# Altium footprint library con-samtec.PCBLIB: 805 footprints (part 51 of 55) (continued)
## TSW-146-02-S-D-RA [mil]
pads (92):
  oct 59.06x59.06 hole 39.37: 1(2250,60) 2(2250,160) 3(2150,60) 4(2150,160) 5(2050,60) 6(2050,160) 7(1950,60) 8(1950,160) 9(1850,60) 10(1850,160) 11(1750,60) 12(1750,160) 13(1650,60) 14(1650,160) 15(1550,60) 16(1550,160) 17(1450,60) 18(1450,160) 19(1350,60) 20(1350,160) 21(1250,60) 22(1250,160) 23(1150,60) 24(1150,160) 25(1050,60) 26(1050,160) 27(950,60) 28(950,160) 29(850,60) 30(850,160) 31(750,60) 32(750,160) 33(650,60) 34(650,160) 35(550,60) 36(550,160) 37(450,60) 38(450,160) 39(350,60) 40(350,160) 41(250,60) 42(250,160) 43(150,60) 44(150,160) 45(50,60) 46(50,160) 47(-50,60) 48(-50,160) 49(-150,60) 50(-150,160) 51(-250,60) 52(-250,160) 53(-350,60) 54(-350,160) 55(-450,60) 56(-450,160) 57(-550,60) 58(-550,160) 59(-650,60) 60(-650,160) 61(-750,60) 62(-750,160) 63(-850,60) 64(-850,160) 65(-950,60) 66(-950,160) 67(-1050,60) 68(-1050,160) 69(-1150,60) 70(-1150,160) 71(-1250,60) 72(-1250,160) 73(-1350,60) 74(-1350,160) 75(-1450,60) 76(-1450,160) 77(-1550,60) 78(-1550,160) 79(-1650,60) 80(-1650,160) 81(-1750,60) 82(-1750,160) 83(-1850,60) 84(-1850,160) 85(-1950,60) 86(-1950,160) 87(-2050,60) 88(-2050,160) 89(-2150,60) 90(-2150,160) 91(-2250,60) 92(-2250,160)
Top Overlay:
  rectangle: -2260,-310.63 -2240,-80.32
  rectangle: -2160,-310.63 -2140,-80.32
  rectangle: -2060,-310.63 -2040,-80.32
  rectangle: -1960,-310.63 -1940,-80.32
  rectangle: -1860,-310.63 -1840,-80.32
  rectangle: -1760,-310.63 -1740,-80.32
  rectangle: -1660,-310.63 -1640,-80.32
  rectangle: -1560,-310.63 -1540,-80.32
  rectangle: -1460,-310.63 -1440,-80.32
  rectangle: -1360,-310.63 -1340,-80.32
  rectangle: -1260,-310.63 -1240,-80.32
  rectangle: -1160,-310.63 -1140,-80.32
  rectangle: -1060,-310.63 -1040,-80.32
  rectangle: -960,-310.63 -940,-80.32
  rectangle: -860,-310.63 -840,-80.32
  rectangle: -760,-310.63 -740,-80.32
  rectangle: -660,-310.63 -640,-80.32
  rectangle: -560,-310.63 -540,-80.32
  rectangle: -460,-310.63 -440,-80.32
  rectangle: -360,-310.63 -340,-80.32
  rectangle: -260,-310.63 -240,-80.32
  rectangle: -160,-310.63 -140,-80.32
  rectangle: -60,-310.63 -40,-80.32
  rectangle: 40,-310.63 60,-80.32
  rectangle: 140,-310.63 160,-80.32
  rectangle: 240,-310.63 260,-80.32
  rectangle: 340,-310.63 360,-80.32
  rectangle: 440,-310.63 460,-80.32
  rectangle: 540,-310.63 560,-80.32
  rectangle: 640,-310.63 660,-80.32
  rectangle: 740,-310.63 760,-80.32
  rectangle: 840,-310.63 860,-80.32
  rectangle: 940,-310.63 960,-80.32
  rectangle: 1040,-310.63 1060,-80.32
  rectangle: 1140,-310.63 1160,-80.32
  rectangle: 1240,-310.63 1260,-80.32
  rectangle: 1340,-310.63 1360,-80.32
  rectangle: 1440,-310.63 1460,-80.32
  rectangle: 1540,-310.63 1560,-80.32
  rectangle: 1640,-310.63 1660,-80.32
  rectangle: 1740,-310.63 1760,-80.32
  rectangle: 1840,-310.63 1860,-80.32
  rectangle: 1940,-310.63 1960,-80.32
  rectangle: 2040,-310.63 2060,-80.32
  rectangle: 2140,-310.63 2160,-80.32
  rectangle: 2240,-310.63 2260,-80.32
  lines w8: -2305.08,-80.55 2305.08,-80.55 2305.08,-4.17 -2305.08,-4.17 -2305.08,-80.55
  text "1" at 2300.59,30.51 h36.81
  text "2" at 2299.21,129.53 h36.81
Mechanical 16:
  rectangle: -2260,0 -2240,170
  rectangle: -2160,0 -2140,170
  rectangle: -2060,0 -2040,170
  rectangle: -1960,0 -1940,170
  rectangle: -1860,0 -1840,170
  rectangle: -1760,0 -1740,170
  rectangle: -1660,0 -1640,170
  rectangle: -1560,0 -1540,170
  rectangle: -1460,0 -1440,170
  rectangle: -1360,0 -1340,170
  rectangle: -1260,0 -1240,170
  rectangle: -1160,0 -1140,170
  rectangle: -1060,0 -1040,170
  rectangle: -960,0 -940,170
  rectangle: -860,0 -840,170
  rectangle: -760,0 -740,170
  rectangle: -660,0 -640,170
  rectangle: -560,0 -540,170
  rectangle: -460,0 -440,170
  rectangle: -360,0 -340,170
  rectangle: -260,0 -240,170
  rectangle: -160,0 -140,170
  rectangle: -60,0 -40,170
  rectangle: 40,0 60,170
  rectangle: 140,0 160,170
  rectangle: 240,0 260,170
  rectangle: 340,0 360,170
  rectangle: 440,0 460,170
  rectangle: 540,0 560,170
  rectangle: 640,0 660,170
  rectangle: 740,0 760,170
  rectangle: 840,0 860,170
  rectangle: 940,0 960,170
  rectangle: 1040,0 1060,170
  rectangle: 1140,0 1160,170
  rectangle: 1240,0 1260,170
  rectangle: 1340,0 1360,170
  rectangle: 1440,0 1460,170
  rectangle: 1540,0 1560,170
  rectangle: 1640,0 1660,170
  rectangle: 1740,0 1760,170
  rectangle: 1840,0 1860,170
  rectangle: 1940,0 1960,170
  rectangle: 2040,0 2060,170
  rectangle: 2140,0 2160,170
  rectangle: 2240,0 2260,170

## TSW-146-02-S-Q [mm]
pads (92):
  oct 1.5x1.5 hole 1: 1(57.15,-2.54) 2(57.15,2.54) 3(54.61,-2.54) 4(54.61,2.54) 5(52.07,-2.54) 6(52.07,2.54) 7(49.53,-2.54) 8(49.53,2.54) 9(46.99,-2.54) 10(46.99,2.54) 11(44.45,-2.54) 12(44.45,2.54) 13(41.91,-2.54) 14(41.91,2.54) 15(39.37,-2.54) 16(39.37,2.54) 17(36.83,-2.54) 18(36.83,2.54) 19(34.29,-2.54) 20(34.29,2.54) 21(31.75,-2.54) 22(31.75,2.54) 23(29.21,-2.54) 24(29.21,2.54) 25(26.67,-2.54) 26(26.67,2.54) 27(24.13,-2.54) 28(24.13,2.54) 29(21.59,-2.54) 30(21.59,2.54) 31(19.05,-2.54) 32(19.05,2.54) 33(16.51,-2.54) 34(16.51,2.54) 35(13.97,-2.54) 36(13.97,2.54) 37(11.43,-2.54) 38(11.43,2.54) 39(8.89,-2.54) 40(8.89,2.54) 41(6.35,-2.54) 42(6.35,2.54) 43(3.81,-2.54) 44(3.81,2.54) 45(1.27,-2.54) 46(1.27,2.54) 47(-1.27,-2.54) 48(-1.27,2.54) 49(-3.81,-2.54) 50(-3.81,2.54) 51(-6.35,-2.54) 52(-6.35,2.54) 53(-8.89,-2.54) 54(-8.89,2.54) 55(-11.43,-2.54) 56(-11.43,2.54) 57(-13.97,-2.54) 58(-13.97,2.54) 59(-16.51,-2.54) 60(-16.51,2.54) 61(-19.05,-2.54) 62(-19.05,2.54) 63(-21.59,-2.54) 64(-21.59,2.54) 65(-24.13,-2.54) 66(-24.13,2.54) 67(-26.67,-2.54) 68(-26.67,2.54) 69(-29.21,-2.54) 70(-29.21,2.54) 71(-31.75,-2.54) 72(-31.75,2.54) 73(-34.29,-2.54) 74(-34.29,2.54) 75(-36.83,-2.54) 76(-36.83,2.54) 77(-39.37,-2.54) 78(-39.37,2.54) 79(-41.91,-2.54) 80(-41.91,2.54) 81(-44.45,-2.54) 82(-44.45,2.54) 83(-46.99,-2.54) 84(-46.99,2.54) 85(-49.53,-2.54) 86(-49.53,2.54) 87(-52.07,-2.54) 88(-52.07,2.54) 89(-54.61,-2.54) 90(-54.61,2.54) 91(-57.15,-2.54) 92(-57.15,2.54)
Top Overlay:
  lines w0.203: -58.549,-3.695 58.549,-3.695 58.549,3.695 -58.549,3.695 -58.549,-3.695
  text "1" at 56.992,-5.138 h0.94
  text "2" at 56.892,3.989 h0.94
Mechanical 16:
  rectangle: -57.5,-2.89 -56.8,-2.19
  rectangle: -57.5,2.19 -56.8,2.89
  rectangle: -54.96,-2.89 -54.26,-2.19
  rectangle: -54.96,2.19 -54.26,2.89
  rectangle: -52.42,-2.89 -51.72,-2.19
  rectangle: -52.42,2.19 -51.72,2.89
  rectangle: -49.88,-2.89 -49.18,-2.19
  rectangle: -49.88,2.19 -49.18,2.89
  rectangle: -47.34,-2.89 -46.64,-2.19
  rectangle: -47.34,2.19 -46.64,2.89
  rectangle: -44.8,-2.89 -44.1,-2.19
  rectangle: -44.8,2.19 -44.1,2.89
  rectangle: -42.26,-2.89 -41.56,-2.19
  rectangle: -42.26,2.19 -41.56,2.89
  rectangle: -39.72,-2.89 -39.02,-2.19
  rectangle: -39.72,2.19 -39.02,2.89
  rectangle: -37.18,-2.89 -36.48,-2.19
  rectangle: -37.18,2.19 -36.48,2.89
  rectangle: -34.64,-2.89 -33.94,-2.19
  rectangle: -34.64,2.19 -33.94,2.89
  rectangle: -32.1,-2.89 -31.4,-2.19
  rectangle: -32.1,2.19 -31.4,2.89
  rectangle: -29.56,-2.89 -28.86,-2.19
  rectangle: -29.56,2.19 -28.86,2.89
  rectangle: -27.02,-2.89 -26.32,-2.19
  rectangle: -27.02,2.19 -26.32,2.89
  rectangle: -24.48,-2.89 -23.78,-2.19
  rectangle: -24.48,2.19 -23.78,2.89
  rectangle: -21.94,-2.89 -21.24,-2.19
  rectangle: -21.94,2.19 -21.24,2.89
  rectangle: -19.4,-2.89 -18.7,-2.19
  rectangle: -19.4,2.19 -18.7,2.89
  rectangle: -16.86,-2.89 -16.16,-2.19
  rectangle: -16.86,2.19 -16.16,2.89
  rectangle: -14.32,-2.89 -13.62,-2.19
  rectangle: -14.32,2.19 -13.62,2.89
  rectangle: -11.78,-2.89 -11.08,-2.19
  rectangle: -11.78,2.19 -11.08,2.89
  rectangle: -9.24,-2.89 -8.54,-2.19
  rectangle: -9.24,2.19 -8.54,2.89
  rectangle: -6.7,-2.89 -6,-2.19
  rectangle: -6.7,2.19 -6,2.89
  rectangle: -4.16,-2.89 -3.46,-2.19
  rectangle: -4.16,2.19 -3.46,2.89
  rectangle: -1.62,-2.89 -0.92,-2.19
  rectangle: -1.62,2.19 -0.92,2.89
  rectangle: 0.92,-2.89 1.62,-2.19
  rectangle: 0.92,2.19 1.62,2.89
  rectangle: 3.46,-2.89 4.16,-2.19
  rectangle: 3.46,2.19 4.16,2.89
  rectangle: 6,-2.89 6.7,-2.19
  rectangle: 6,2.19 6.7,2.89
  rectangle: 8.54,-2.89 9.24,-2.19
  rectangle: 8.54,2.19 9.24,2.89
  rectangle: 11.08,-2.89 11.78,-2.19
  rectangle: 11.08,2.19 11.78,2.89
  rectangle: 13.62,-2.89 14.32,-2.19
  rectangle: 13.62,2.19 14.32,2.89
  rectangle: 16.16,-2.89 16.86,-2.19
  rectangle: 16.16,2.19 16.86,2.89
  rectangle: 18.7,-2.89 19.4,-2.19
  rectangle: 18.7,2.19 19.4,2.89
  rectangle: 21.24,-2.89 21.94,-2.19
  rectangle: 21.24,2.19 21.94,2.89
  rectangle: 23.78,-2.89 24.48,-2.19
  rectangle: 23.78,2.19 24.48,2.89
  rectangle: 26.32,-2.89 27.02,-2.19
  rectangle: 26.32,2.19 27.02,2.89
  rectangle: 28.86,-2.89 29.56,-2.19
  rectangle: 28.86,2.19 29.56,2.89
  rectangle: 31.4,-2.89 32.1,-2.19
  rectangle: 31.4,2.19 32.1,2.89
  rectangle: 33.94,-2.89 34.64,-2.19
  rectangle: 33.94,2.19 34.64,2.89
  rectangle: 36.48,-2.89 37.18,-2.19
  rectangle: 36.48,2.19 37.18,2.89
  rectangle: 39.02,-2.89 39.72,-2.19
  rectangle: 39.02,2.19 39.72,2.89
  rectangle: 41.56,-2.89 42.26,-2.19
  rectangle: 41.56,2.19 42.26,2.89
  rectangle: 44.1,-2.89 44.8,-2.19
  rectangle: 44.1,2.19 44.8,2.89
  rectangle: 46.64,-2.89 47.34,-2.19
  rectangle: 46.64,2.19 47.34,2.89
  rectangle: 49.18,-2.89 49.88,-2.19
  rectangle: 49.18,2.19 49.88,2.89
  rectangle: 51.72,-2.89 52.42,-2.19
  rectangle: 51.72,2.19 52.42,2.89
  rectangle: 54.26,-2.89 54.96,-2.19
  rectangle: 54.26,2.19 54.96,2.89
  rectangle: 56.8,-2.89 57.5,-2.19
  rectangle: 56.8,2.19 57.5,2.89

## TSW-146-02-S-Q-RA [mil]
pads (92):
  oct 59.06x59.06 hole 39.37: 1(2250,60) 2(2250,260) 3(2150,60) 4(2150,260) 5(2050,60) 6(2050,260) 7(1950,60) 8(1950,260) 9(1850,60) 10(1850,260) 11(1750,60) 12(1750,260) 13(1650,60) 14(1650,260) 15(1550,60) 16(1550,260) 17(1450,60) 18(1450,260) 19(1350,60) 20(1350,260) 21(1250,60) 22(1250,260) 23(1150,60) 24(1150,260) 25(1050,60) 26(1050,260) 27(950,60) 28(950,260) 29(850,60) 30(850,260) 31(750,60) 32(750,260) 33(650,60) 34(650,260) 35(550,60) 36(550,260) 37(450,60) 38(450,260) 39(350,60) 40(350,260) 41(250,60) 42(250,260) 43(150,60) 44(150,260) 45(50,60) 46(50,260) 47(-50,60) 48(-50,260) 49(-150,60) 50(-150,260) 51(-250,60) 52(-250,260) 53(-350,60) 54(-350,260) 55(-450,60) 56(-450,260) 57(-550,60) 58(-550,260) 59(-650,60) 60(-650,260) 61(-750,60) 62(-750,260) 63(-850,60) 64(-850,260) 65(-950,60) 66(-950,260) 67(-1050,60) 68(-1050,260) 69(-1150,60) 70(-1150,260) 71(-1250,60) 72(-1250,260) 73(-1350,60) 74(-1350,260) 75(-1450,60) 76(-1450,260) 77(-1550,60) 78(-1550,260) 79(-1650,60) 80(-1650,260) 81(-1750,60) 82(-1750,260) 83(-1850,60) 84(-1850,260) 85(-1950,60) 86(-1950,260) 87(-2050,60) 88(-2050,260) 89(-2150,60) 90(-2150,260) 91(-2250,60) 92(-2250,260)
Top Overlay:
  rectangle: -2260,-310.63 -2240,-80.32
  rectangle: -2160,-310.63 -2140,-80.32
  rectangle: -2060,-310.63 -2040,-80.32
  rectangle: -1960,-310.63 -1940,-80.32
  rectangle: -1860,-310.63 -1840,-80.32
  rectangle: -1760,-310.63 -1740,-80.32
  rectangle: -1660,-310.63 -1640,-80.32
  rectangle: -1560,-310.63 -1540,-80.32
  rectangle: -1460,-310.63 -1440,-80.32
  rectangle: -1360,-310.63 -1340,-80.32
  rectangle: -1260,-310.63 -1240,-80.32
  rectangle: -1160,-310.63 -1140,-80.32
  rectangle: -1060,-310.63 -1040,-80.32
  rectangle: -960,-310.63 -940,-80.32
  rectangle: -860,-310.63 -840,-80.32
  rectangle: -760,-310.63 -740,-80.32
  rectangle: -660,-310.63 -640,-80.32
  rectangle: -560,-310.63 -540,-80.32
  rectangle: -460,-310.63 -440,-80.32
  rectangle: -360,-310.63 -340,-80.32
  rectangle: -260,-310.63 -240,-80.32
  rectangle: -160,-310.63 -140,-80.32
  rectangle: -60,-310.63 -40,-80.32
  rectangle: 40,-310.63 60,-80.32
  rectangle: 140,-310.63 160,-80.32
  rectangle: 240,-310.63 260,-80.32
  rectangle: 340,-310.63 360,-80.32
  rectangle: 440,-310.63 460,-80.32
  rectangle: 540,-310.63 560,-80.32
  rectangle: 640,-310.63 660,-80.32
  rectangle: 740,-310.63 760,-80.32
  rectangle: 840,-310.63 860,-80.32
  rectangle: 940,-310.63 960,-80.32
  rectangle: 1040,-310.63 1060,-80.32
  rectangle: 1140,-310.63 1160,-80.32
  rectangle: 1240,-310.63 1260,-80.32
  rectangle: 1340,-310.63 1360,-80.32
  rectangle: 1440,-310.63 1460,-80.32
  rectangle: 1540,-310.63 1560,-80.32
  rectangle: 1640,-310.63 1660,-80.32
  rectangle: 1740,-310.63 1760,-80.32
  rectangle: 1840,-310.63 1860,-80.32
  rectangle: 1940,-310.63 1960,-80.32
  rectangle: 2040,-310.63 2060,-80.32
  rectangle: 2140,-310.63 2160,-80.32
  rectangle: 2240,-310.63 2260,-80.32
  lines w8: -2305.08,-80.55 2305.08,-80.55 2305.08,-4.17 -2305.08,-4.17 -2305.08,-80.55
  text "1" at 2303.54,43.31 h36.81
  text "2" at 2301.18,242.72 h36.81
Mechanical 16:
  rectangle: -2260,0 -2240,270
  rectangle: -2160,0 -2140,270
  rectangle: -2060,0 -2040,270
  rectangle: -1960,0 -1940,270
  rectangle: -1860,0 -1840,270
  rectangle: -1760,0 -1740,270
  rectangle: -1660,0 -1640,270
  rectangle: -1560,0 -1540,270
  rectangle: -1460,0 -1440,270
  rectangle: -1360,0 -1340,270
  rectangle: -1260,0 -1240,270
  rectangle: -1160,0 -1140,270
  rectangle: -1060,0 -1040,270
  rectangle: -960,0 -940,270
  rectangle: -860,0 -840,270
  rectangle: -760,0 -740,270
  rectangle: -660,0 -640,270
  rectangle: -560,0 -540,270
  rectangle: -460,0 -440,270
  rectangle: -360,0 -340,270
  rectangle: -260,0 -240,270
  rectangle: -160,0 -140,270
  rectangle: -60,0 -40,270
  rectangle: 40,0 60,270
  rectangle: 140,0 160,270
  rectangle: 240,0 260,270
  rectangle: 340,0 360,270
  rectangle: 440,0 460,270
  rectangle: 540,0 560,270
  rectangle: 640,0 660,270
  rectangle: 740,0 760,270
  rectangle: 840,0 860,270
  rectangle: 940,0 960,270
  rectangle: 1040,0 1060,270
  rectangle: 1140,0 1160,270
  rectangle: 1240,0 1260,270
  rectangle: 1340,0 1360,270
  rectangle: 1440,0 1460,270
  rectangle: 1540,0 1560,270
  rectangle: 1640,0 1660,270
  rectangle: 1740,0 1760,270
  rectangle: 1840,0 1860,270
  rectangle: 1940,0 1960,270
  rectangle: 2040,0 2060,270
  rectangle: 2140,0 2160,270
  rectangle: 2240,0 2260,270

## TSW-146-02-S-S [mm]
pads (46):
  oct 1.5x1.5 hole 1: 1(57.15,0) 2(54.61,0) 3(52.07,0) 4(49.53,0) 5(46.99,0) 6(44.45,0) 7(41.91,0) 8(39.37,0) 9(36.83,0) 10(34.29,0) 11(31.75,0) 12(29.21,0) 13(26.67,0) 14(24.13,0) 15(21.59,0) 16(19.05,0) 17(16.51,0) 18(13.97,0) 19(11.43,0) 20(8.89,0) 21(6.35,0) 22(3.81,0) 23(1.27,0) 24(-1.27,0) 25(-3.81,0) 26(-6.35,0) 27(-8.89,0) 28(-11.43,0) 29(-13.97,0) 30(-16.51,0) 31(-19.05,0) 32(-21.59,0) 33(-24.13,0) 34(-26.67,0) 35(-29.21,0) 36(-31.75,0) 37(-34.29,0) 38(-36.83,0) 39(-39.37,0) 40(-41.91,0) 41(-44.45,0) 42(-46.99,0) 43(-49.53,0) 44(-52.07,0) 45(-54.61,0) 46(-57.15,0)
Top Overlay:
  lines w0.203: -58.549,-1.155 58.549,-1.155 58.549,1.155 -58.549,1.155 -58.549,-1.155
  text "1" at 56.892,-2.498 h0.94
Mechanical 16:
  rectangle: -57.5,-0.35 -56.8,0.35
  rectangle: -54.96,-0.35 -54.26,0.35
  rectangle: -52.42,-0.35 -51.72,0.35
  rectangle: -49.88,-0.35 -49.18,0.35
  rectangle: -47.34,-0.35 -46.64,0.35
  rectangle: -44.8,-0.35 -44.1,0.35
  rectangle: -42.26,-0.35 -41.56,0.35
  rectangle: -39.72,-0.35 -39.02,0.35
  rectangle: -37.18,-0.35 -36.48,0.35
  rectangle: -34.64,-0.35 -33.94,0.35
  rectangle: -32.1,-0.35 -31.4,0.35
  rectangle: -29.56,-0.35 -28.86,0.35
  rectangle: -27.02,-0.35 -26.32,0.35
  rectangle: -24.48,-0.35 -23.78,0.35
  rectangle: -21.94,-0.35 -21.24,0.35
  rectangle: -19.4,-0.35 -18.7,0.35
  rectangle: -16.86,-0.35 -16.16,0.35
  rectangle: -14.32,-0.35 -13.62,0.35
  rectangle: -11.78,-0.35 -11.08,0.35
  rectangle: -9.24,-0.35 -8.54,0.35
  rectangle: -6.7,-0.35 -6,0.35
  rectangle: -4.16,-0.35 -3.46,0.35
  rectangle: -1.62,-0.35 -0.92,0.35
  rectangle: 0.92,-0.35 1.62,0.35
  rectangle: 3.46,-0.35 4.16,0.35
  rectangle: 6,-0.35 6.7,0.35
  rectangle: 8.54,-0.35 9.24,0.35
  rectangle: 11.08,-0.35 11.78,0.35
  rectangle: 13.62,-0.35 14.32,0.35
  rectangle: 16.16,-0.35 16.86,0.35
  rectangle: 18.7,-0.35 19.4,0.35
  rectangle: 21.24,-0.35 21.94,0.35
  rectangle: 23.78,-0.35 24.48,0.35
  rectangle: 26.32,-0.35 27.02,0.35
  rectangle: 28.86,-0.35 29.56,0.35
  rectangle: 31.4,-0.35 32.1,0.35
  rectangle: 33.94,-0.35 34.64,0.35
  rectangle: 36.48,-0.35 37.18,0.35
  rectangle: 39.02,-0.35 39.72,0.35
  rectangle: 41.56,-0.35 42.26,0.35
  rectangle: 44.1,-0.35 44.8,0.35
  rectangle: 46.64,-0.35 47.34,0.35
  rectangle: 49.18,-0.35 49.88,0.35
  rectangle: 51.72,-0.35 52.42,0.35
  rectangle: 54.26,-0.35 54.96,0.35
  rectangle: 56.8,-0.35 57.5,0.35

## TSW-146-02-S-S-RA [mil]
pads (46):
  oct 59.06x59.06 hole 39.37: 1(2250,60) 2(2150,60) 3(2050,60) 4(1950,60) 5(1850,60) 6(1750,60) 7(1650,60) 8(1550,60) 9(1450,60) 10(1350,60) 11(1250,60) 12(1150,60) 13(1050,60) 14(950,60) 15(850,60) 16(750,60) 17(650,60) 18(550,60) 19(450,60) 20(350,60) 21(250,60) 22(150,60) 23(50,60) 24(-50,60) 25(-150,60) 26(-250,60) 27(-350,60) 28(-450,60) 29(-550,60) 30(-650,60) 31(-750,60) 32(-850,60) 33(-950,60) 34(-1050,60) 35(-1150,60) 36(-1250,60) 37(-1350,60) 38(-1450,60) 39(-1550,60) 40(-1650,60) 41(-1750,60) 42(-1850,60) 43(-1950,60) 44(-2050,60) 45(-2150,60) 46(-2250,60)
Top Overlay:
  rectangle: -2260,-310.63 -2240,-80.32
  rectangle: -2160,-310.63 -2140,-80.32
  rectangle: -2060,-310.63 -2040,-80.32
  rectangle: -1960,-310.63 -1940,-80.32
  rectangle: -1860,-310.63 -1840,-80.32
  rectangle: -1760,-310.63 -1740,-80.32
  rectangle: -1660,-310.63 -1640,-80.32
  rectangle: -1560,-310.63 -1540,-80.32
  rectangle: -1460,-310.63 -1440,-80.32
  rectangle: -1360,-310.63 -1340,-80.32
  rectangle: -1260,-310.63 -1240,-80.32
  rectangle: -1160,-310.63 -1140,-80.32
  rectangle: -1060,-310.63 -1040,-80.32
  rectangle: -960,-310.63 -940,-80.32
  rectangle: -860,-310.63 -840,-80.32
  rectangle: -760,-310.63 -740,-80.32
  rectangle: -660,-310.63 -640,-80.32
  rectangle: -560,-310.63 -540,-80.32
  rectangle: -460,-310.63 -440,-80.32
  rectangle: -360,-310.63 -340,-80.32
  rectangle: -260,-310.63 -240,-80.32
  rectangle: -160,-310.63 -140,-80.32
  rectangle: -60,-310.63 -40,-80.32
  rectangle: 40,-310.63 60,-80.32
  rectangle: 140,-310.63 160,-80.32
  rectangle: 240,-310.63 260,-80.32
  rectangle: 340,-310.63 360,-80.32
  rectangle: 440,-310.63 460,-80.32
  rectangle: 540,-310.63 560,-80.32
  rectangle: 640,-310.63 660,-80.32
  rectangle: 740,-310.63 760,-80.32
  rectangle: 840,-310.63 860,-80.32
  rectangle: 940,-310.63 960,-80.32
  rectangle: 1040,-310.63 1060,-80.32
  rectangle: 1140,-310.63 1160,-80.32
  rectangle: 1240,-310.63 1260,-80.32
  rectangle: 1340,-310.63 1360,-80.32
  rectangle: 1440,-310.63 1460,-80.32
  rectangle: 1540,-310.63 1560,-80.32
  rectangle: 1640,-310.63 1660,-80.32
  rectangle: 1740,-310.63 1760,-80.32
  rectangle: 1840,-310.63 1860,-80.32
  rectangle: 1940,-310.63 1960,-80.32
  rectangle: 2040,-310.63 2060,-80.32
  rectangle: 2140,-310.63 2160,-80.32
  rectangle: 2240,-310.63 2260,-80.32
  lines w8: -2305.08,-80.55 2305.08,-80.55 2305.08,-4.17 -2305.08,-4.17 -2305.08,-80.55
  text "1" at 2300.47,45.35 h36.81
Mechanical 16:
  rectangle: -2260,0 -2240,70
  rectangle: -2160,0 -2140,70
  rectangle: -2060,0 -2040,70
  rectangle: -1960,0 -1940,70
  rectangle: -1860,0 -1840,70
  rectangle: -1760,0 -1740,70
  rectangle: -1660,0 -1640,70
  rectangle: -1560,0 -1540,70
  rectangle: -1460,0 -1440,70
  rectangle: -1360,0 -1340,70
  rectangle: -1260,0 -1240,70
  rectangle: -1160,0 -1140,70
  rectangle: -1060,0 -1040,70
  rectangle: -960,0 -940,70
  rectangle: -860,0 -840,70
  rectangle: -760,0 -740,70
  rectangle: -660,0 -640,70
  rectangle: -560,0 -540,70
  rectangle: -460,0 -440,70
  rectangle: -360,0 -340,70
  rectangle: -260,0 -240,70
  rectangle: -160,0 -140,70
  rectangle: -60,0 -40,70
  rectangle: 40,0 60,70
  rectangle: 140,0 160,70
  rectangle: 240,0 260,70
  rectangle: 340,0 360,70
  rectangle: 440,0 460,70
  rectangle: 540,0 560,70
  rectangle: 640,0 660,70
  rectangle: 740,0 760,70
  rectangle: 840,0 860,70
  rectangle: 940,0 960,70
  rectangle: 1040,0 1060,70
  rectangle: 1140,0 1160,70
  rectangle: 1240,0 1260,70
  rectangle: 1340,0 1360,70
  rectangle: 1440,0 1460,70
  rectangle: 1540,0 1560,70
  rectangle: 1640,0 1660,70
  rectangle: 1740,0 1760,70
  rectangle: 1840,0 1860,70
  rectangle: 1940,0 1960,70
  rectangle: 2040,0 2060,70
  rectangle: 2140,0 2160,70
  rectangle: 2240,0 2260,70

## TSW-146-02-S-T [mm]
pads (138):
  oct 1.5x1.5 hole 1: 1(57.15,-2.54) 2(57.15,0) 3(57.15,2.54) 4(54.61,-2.54) 5(54.61,0) 6(54.61,2.54) 7(52.07,-2.54) 8(52.07,0) 9(52.07,2.54) 10(49.53,-2.54) 11(49.53,0) 12(49.53,2.54) 13(46.99,-2.54) 14(46.99,0) 15(46.99,2.54) 16(44.45,-2.54) 17(44.45,0) 18(44.45,2.54) 19(41.91,-2.54) 20(41.91,0) 21(41.91,2.54) 22(39.37,-2.54) 23(39.37,0) 24(39.37,2.54) 25(36.83,-2.54) 26(36.83,0) 27(36.83,2.54) 28(34.29,-2.54) 29(34.29,0) 30(34.29,2.54) 31(31.75,-2.54) 32(31.75,0) 33(31.75,2.54) 34(29.21,-2.54) 35(29.21,0) 36(29.21,2.54) 37(26.67,-2.54) 38(26.67,0) 39(26.67,2.54) 40(24.13,-2.54) 41(24.13,0) 42(24.13,2.54) 43(21.59,-2.54) 44(21.59,0) 45(21.59,2.54) 46(19.05,-2.54) 47(19.05,0) 48(19.05,2.54) 49(16.51,-2.54) 50(16.51,0) 51(16.51,2.54) 52(13.97,-2.54) 53(13.97,0) 54(13.97,2.54) 55(11.43,-2.54) 56(11.43,0) 57(11.43,2.54) 58(8.89,-2.54) 59(8.89,0) 60(8.89,2.54) 61(6.35,-2.54) 62(6.35,0) 63(6.35,2.54) 64(3.81,-2.54) 65(3.81,0) 66(3.81,2.54) 67(1.27,-2.54) 68(1.27,0) 69(1.27,2.54) 70(-1.27,-2.54) 71(-1.27,0) 72(-1.27,2.54) 73(-3.81,-2.54) 74(-3.81,0) 75(-3.81,2.54) 76(-6.35,-2.54) 77(-6.35,0) 78(-6.35,2.54) 79(-8.89,-2.54) 80(-8.89,0) 81(-8.89,2.54) 82(-11.43,-2.54) 83(-11.43,0) 84(-11.43,2.54) 85(-13.97,-2.54) 86(-13.97,0) 87(-13.97,2.54) 88(-16.51,-2.54) 89(-16.51,0) 90(-16.51,2.54) 91(-19.05,-2.54) 92(-19.05,0) 93(-19.05,2.54) 94(-21.59,-2.54) 95(-21.59,0) 96(-21.59,2.54) 97(-24.13,-2.54) 98(-24.13,0) 99(-24.13,2.54) 100(-26.67,-2.54) 101(-26.67,0) 102(-26.67,2.54) 103(-29.21,-2.54) 104(-29.21,0) 105(-29.21,2.54) 106(-31.75,-2.54) 107(-31.75,0) 108(-31.75,2.54) 109(-34.29,-2.54) 110(-34.29,0) 111(-34.29,2.54) 112(-36.83,-2.54) 113(-36.83,0) 114(-36.83,2.54) 115(-39.37,-2.54) 116(-39.37,0) 117(-39.37,2.54) 118(-41.91,-2.54) 119(-41.91,0) 120(-41.91,2.54) 121(-44.45,-2.54) 122(-44.45,0) 123(-44.45,2.54) 124(-46.99,-2.54) 125(-46.99,0) 126(-46.99,2.54) 127(-49.53,-2.54) 128(-49.53,0) 129(-49.53,2.54) 130(-52.07,-2.54) 131(-52.07,0) 132(-52.07,2.54) 133(-54.61,-2.54) 134(-54.61,0) 135(-54.61,2.54) 136(-57.15,-2.54) 137(-57.15,0) 138(-57.15,2.54)
Top Overlay:
  lines w0.203: -58.549,-3.695 58.549,-3.695 58.549,3.695 -58.549,3.695 -58.549,-3.695
  text "1" at 56.842,-5.188 h0.94
  text "3" at 56.838,3.989 h0.94
Mechanical 16:
  rectangle: -57.5,-2.89 -56.8,-2.19
  rectangle: -57.5,-0.35 -56.8,0.35
  rectangle: -57.5,2.19 -56.8,2.89
  rectangle: -54.96,-2.89 -54.26,-2.19
  rectangle: -54.96,-0.35 -54.26,0.35
  rectangle: -54.96,2.19 -54.26,2.89
  rectangle: -52.42,-2.89 -51.72,-2.19
  rectangle: -52.42,-0.35 -51.72,0.35
  rectangle: -52.42,2.19 -51.72,2.89
  rectangle: -49.88,-2.89 -49.18,-2.19
  rectangle: -49.88,-0.35 -49.18,0.35
  rectangle: -49.88,2.19 -49.18,2.89
  rectangle: -47.34,-2.89 -46.64,-2.19
  rectangle: -47.34,-0.35 -46.64,0.35
  rectangle: -47.34,2.19 -46.64,2.89
  rectangle: -44.8,-2.89 -44.1,-2.19
  rectangle: -44.8,-0.35 -44.1,0.35
  rectangle: -44.8,2.19 -44.1,2.89
  rectangle: -42.26,-2.89 -41.56,-2.19
  rectangle: -42.26,-0.35 -41.56,0.35
  rectangle: -42.26,2.19 -41.56,2.89
  rectangle: -39.72,-2.89 -39.02,-2.19
  rectangle: -39.72,-0.35 -39.02,0.35
  rectangle: -39.72,2.19 -39.02,2.89
  rectangle: -37.18,-2.89 -36.48,-2.19
  rectangle: -37.18,-0.35 -36.48,0.35
  rectangle: -37.18,2.19 -36.48,2.89
  rectangle: -34.64,-2.89 -33.94,-2.19
  rectangle: -34.64,-0.35 -33.94,0.35
  rectangle: -34.64,2.19 -33.94,2.89
  rectangle: -32.1,-2.89 -31.4,-2.19
  rectangle: -32.1,-0.35 -31.4,0.35
  rectangle: -32.1,2.19 -31.4,2.89
  rectangle: -29.56,-2.89 -28.86,-2.19
  rectangle: -29.56,-0.35 -28.86,0.35
  rectangle: -29.56,2.19 -28.86,2.89
  rectangle: -27.02,-2.89 -26.32,-2.19
  rectangle: -27.02,-0.35 -26.32,0.35
  rectangle: -27.02,2.19 -26.32,2.89
  rectangle: -24.48,-2.89 -23.78,-2.19
  rectangle: -24.48,-0.35 -23.78,0.35
  rectangle: -24.48,2.19 -23.78,2.89
  rectangle: -21.94,-2.89 -21.24,-2.19
  rectangle: -21.94,-0.35 -21.24,0.35
  rectangle: -21.94,2.19 -21.24,2.89
  rectangle: -19.4,-2.89 -18.7,-2.19
  rectangle: -19.4,-0.35 -18.7,0.35
  rectangle: -19.4,2.19 -18.7,2.89
  rectangle: -16.86,-2.89 -16.16,-2.19
  rectangle: -16.86,-0.35 -16.16,0.35
  rectangle: -16.86,2.19 -16.16,2.89
  rectangle: -14.32,-2.89 -13.62,-2.19
  rectangle: -14.32,-0.35 -13.62,0.35
  rectangle: -14.32,2.19 -13.62,2.89
  rectangle: -11.78,-2.89 -11.08,-2.19
  rectangle: -11.78,-0.35 -11.08,0.35
  rectangle: -11.78,2.19 -11.08,2.89
  rectangle: -9.24,-2.89 -8.54,-2.19
  rectangle: -9.24,-0.35 -8.54,0.35
  rectangle: -9.24,2.19 -8.54,2.89
  rectangle: -6.7,-2.89 -6,-2.19
  rectangle: -6.7,-0.35 -6,0.35
  rectangle: -6.7,2.19 -6,2.89
  rectangle: -4.16,-2.89 -3.46,-2.19
  rectangle: -4.16,-0.35 -3.46,0.35
  rectangle: -4.16,2.19 -3.46,2.89
  rectangle: -1.62,-2.89 -0.92,-2.19
  rectangle: -1.62,-0.35 -0.92,0.35
  rectangle: -1.62,2.19 -0.92,2.89
  rectangle: 0.92,-2.89 1.62,-2.19
  rectangle: 0.92,-0.35 1.62,0.35
  rectangle: 0.92,2.19 1.62,2.89
  rectangle: 3.46,-2.89 4.16,-2.19
  rectangle: 3.46,-0.35 4.16,0.35
  rectangle: 3.46,2.19 4.16,2.89
  rectangle: 6,-2.89 6.7,-2.19
  rectangle: 6,-0.35 6.7,0.35
  rectangle: 6,2.19 6.7,2.89
  rectangle: 8.54,-2.89 9.24,-2.19
  rectangle: 8.54,-0.35 9.24,0.35
  rectangle: 8.54,2.19 9.24,2.89
  rectangle: 11.08,-2.89 11.78,-2.19
  rectangle: 11.08,-0.35 11.78,0.35
  rectangle: 11.08,2.19 11.78,2.89
  rectangle: 13.62,-2.89 14.32,-2.19
  rectangle: 13.62,-0.35 14.32,0.35
  rectangle: 13.62,2.19 14.32,2.89
  rectangle: 16.16,-2.89 16.86,-2.19
  rectangle: 16.16,-0.35 16.86,0.35
  rectangle: 16.16,2.19 16.86,2.89
  rectangle: 18.7,-2.89 19.4,-2.19
  rectangle: 18.7,-0.35 19.4,0.35
  rectangle: 18.7,2.19 19.4,2.89
  rectangle: 21.24,-2.89 21.94,-2.19
  rectangle: 21.24,-0.35 21.94,0.35
  rectangle: 21.24,2.19 21.94,2.89
  rectangle: 23.78,-2.89 24.48,-2.19
  rectangle: 23.78,-0.35 24.48,0.35
  rectangle: 23.78,2.19 24.48,2.89
  rectangle: 26.32,-2.89 27.02,-2.19
  rectangle: 26.32,-0.35 27.02,0.35
  rectangle: 26.32,2.19 27.02,2.89
  rectangle: 28.86,-2.89 29.56,-2.19
  rectangle: 28.86,-0.35 29.56,0.35
  rectangle: 28.86,2.19 29.56,2.89
  rectangle: 31.4,-2.89 32.1,-2.19
  rectangle: 31.4,-0.35 32.1,0.35
  rectangle: 31.4,2.19 32.1,2.89
  rectangle: 33.94,-2.89 34.64,-2.19
  rectangle: 33.94,-0.35 34.64,0.35
  rectangle: 33.94,2.19 34.64,2.89
  rectangle: 36.48,-2.89 37.18,-2.19
  rectangle: 36.48,-0.35 37.18,0.35
  rectangle: 36.48,2.19 37.18,2.89
  rectangle: 39.02,-2.89 39.72,-2.19
  rectangle: 39.02,-0.35 39.72,0.35
  rectangle: 39.02,2.19 39.72,2.89
  rectangle: 41.56,-2.89 42.26,-2.19
  rectangle: 41.56,-0.35 42.26,0.35
  rectangle: 41.56,2.19 42.26,2.89
  rectangle: 44.1,-2.89 44.8,-2.19
  rectangle: 44.1,-0.35 44.8,0.35
  rectangle: 44.1,2.19 44.8,2.89
  rectangle: 46.64,-2.89 47.34,-2.19
  rectangle: 46.64,-0.35 47.34,0.35
  rectangle: 46.64,2.19 47.34,2.89
  rectangle: 49.18,-2.89 49.88,-2.19
  rectangle: 49.18,-0.35 49.88,0.35
  rectangle: 49.18,2.19 49.88,2.89
  rectangle: 51.72,-2.89 52.42,-2.19
  rectangle: 51.72,-0.35 52.42,0.35
  rectangle: 51.72,2.19 52.42,2.89
  rectangle: 54.26,-2.89 54.96,-2.19
  rectangle: 54.26,-0.35 54.96,0.35
  rectangle: 54.26,2.19 54.96,2.89
  rectangle: 56.8,-2.89 57.5,-2.19
  rectangle: 56.8,-0.35 57.5,0.35
  rectangle: 56.8,2.19 57.5,2.89